# Altium footprint library bethu.PcbLib: 628 footprints (part 3 of 40)
Each footprint in its own frame and in the unit in brackets; x right, y up, seen from the top. Pads: shape width x height; smd on the part's side, far side on the other; paste and mask are expansions set on the pad; w line width, h text height; cw(c..) or ccw(c..) is an arc to the next point about the centre after c.
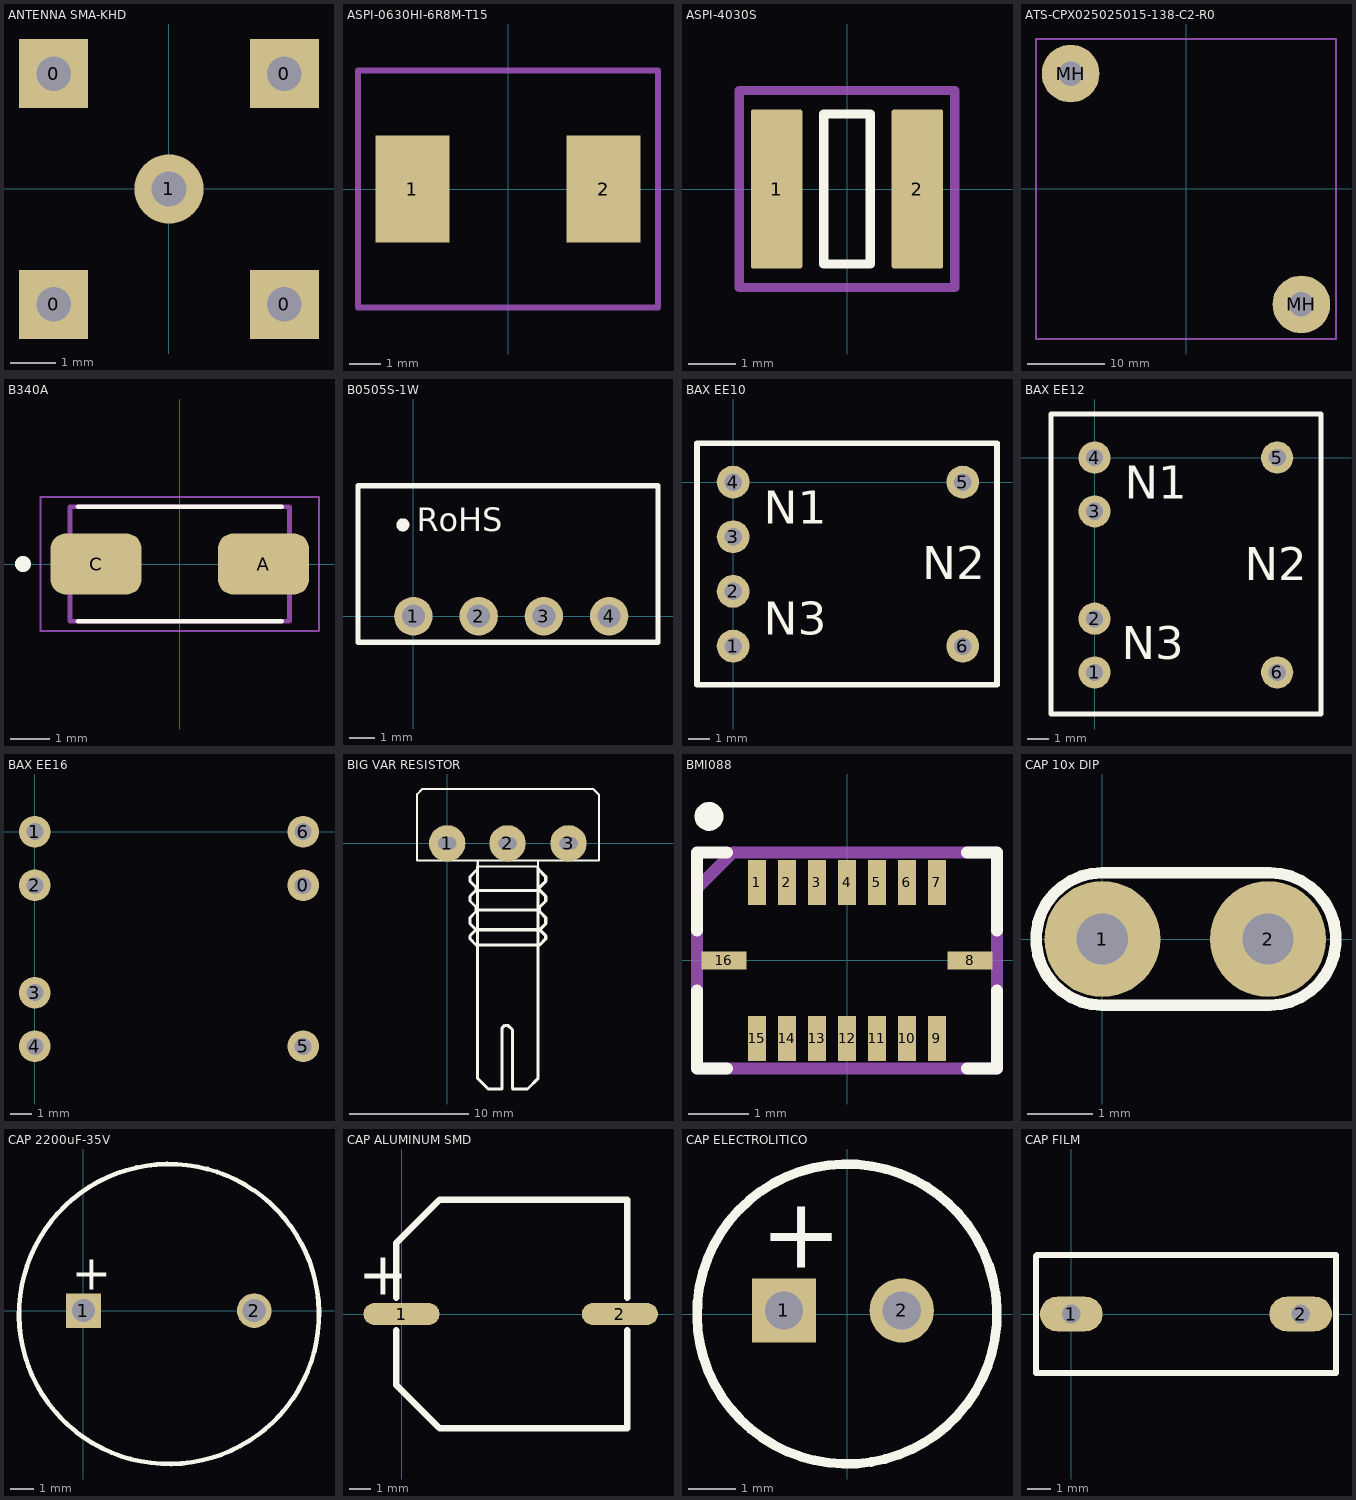
[diagram p2: the footprints below, top view; thin cyan lines are the x and y axes]

## ANTENNA SMA-KHD [mil]
pads (5):
  rect 60x60 hole 30 unplated: 0(-100,-100) 0(-100,100) 0(100,-100) 0(100,100)
  round 60 hole 30: 1(0,0)
3D body "RP_SMA Connector.SLDPRT": height 393.7, standoff -153.54, extent -137.8,-137.79 543.3,137.8

## ASPI-0630HI-6R8M-T15 [mm]
pads (2):
  rect 2.35x3.4 smd: 1(-3.025,0) 2(3.025,0)
Mechanical 13:
  lines w0.2: -4.75,-3.75 4.75,-3.75 4.75,3.75 -4.75,3.75 -4.75,-2 -4.75,-3.75
  text "'.Designator'" at -4.682,-0.75 h0.8
3D body "ASPI-0630HI.STEP": height 3.01, standoff 0.01, extent -3.6,-3.325 3.6,3.325

## ASPI-4030S [mm]
pads (2):
  rrect10% 1.1x3.4 smd: 1(-1.5,0) 2(1.5,0)
Top Overlay:
  lines w0.2: -0.5,-1.6 -0.5,1.6 0.5,1.6 0.5,-1.6 -0.5,-1.6
Mechanical 13:
  lines w0.2: -2.3,-2.1 -2.3,2.1 2.3,2.1 2.3,-2.1 0,-2.1 -2.3,-2.1
  text ".Designator" at -4.998,-0.333 h1
3D body "ASPI-4030S.STEP": height 3.01, standoff 0.01, extent -2,-2 2,2

## ATS-CPX025025015-138-C2-R0 [mm]
pads (2):
  round 7.5 hole 3.175: MH(-15,15) MH(15,-15)
Mechanical 13:
  lines w0.2: -19.5,-19.5 19.5,-19.5 19.5,19.5 -19.5,19.5 -19.5,-19.5
  text "'.Designator'" at -5.665,-0.417 h1
3D body "ATS-CPX-138-CX-R0_FUSED.STEP": height 18.5, standoff 3.5, extent -18.996,-18.996 18.996,18.996

## B340A [mm]
pads (2):
  rrect50% 2.33x1.55 smd: A(2.135,0) C(-2.135,0)
Top Overlay:
  circle w0.2: c-4,0 r0.1
  lines w0.127: -2.6,-1.46 2.6,-1.46 ; -2.6,1.46 2.6,1.46
Mechanical 13:
  circle w0.2: c-4,0 r0.1
  lines w0.127: -2.8,-1.46 2.8,-1.46 2.8,1.46 -2.8,1.46 -2.8,-1.46
Mechanical 15:
  lines w0.05: -3.55,-1.71 3.55,-1.71 3.55,1.71 -3.55,1.71 -3.55,-1.71
3D body "B340A-13.STEP": height 2.4, standoff 0, extent -2.597,-1.303 2.597,1.302

## B0505S-1W [mm]
pads (4):
  round 1.5 hole 0.9: 1(0,0) 2(2.54,0) 3(5.08,0) 4(7.62,0)
Top Overlay:
  circle w0.254: c-0.411,3.556 r0.127
  lines w0.2: -2.159,-1.016 -2.159,5.08 9.525,5.08 9.525,-1.016 -2.159,-1.016
  text "RoHS" at 0.127,3.302 h0.91
3D body "B0505S-1W.STEP": height 9.75, standoff -4.35, extent -2.117,-1.016 9.483,4.984

## BAX EE10 [mm]
pads (6):
  round 1.5 hole 0.8: 1(0,-7.5) 2(0,-5) 3(0,-2.5) 4(0,0) 5(10.5,0) 6(10.5,-7.5)
Top Overlay:
  lines w0.254: -1.651,-9.271 -1.651,1.778 12.065,1.778 12.065,-9.271 -1.651,-9.271
  text "N1" at 1.397,-1.905 h1.52
  text "N3" at 1.397,-6.985 h1.52
  text "N2" at 8.636,-4.445 h1.52
3D body "thinh_1.STEP": height 9.5, standoff -3.5, extent -1.893,-9.398 12.307,1.902

## BAX EE12 [mm]
pads (6):
  round 1.5 hole 0.8: 1(0,-10) 2(0,-7.5) 3(0,-2.5) 4(0,0) 5(8.5,0) 6(8.5,-10)
Top Overlay:
  lines w0.254: -2.032,-11.938 -2.032,2.032 10.541,2.032 10.541,-11.938 -2.032,-11.938
  text "N1" at 1.397,-1.905 h1.52
  text "N3" at 1.27,-9.398 h1.52
  text "N2" at 6.985,-5.715 h1.52
3D body "thinh_2.STEP": height 10.25, standoff -4.1, extent -1.991,-11.953 10.509,2.047

## BAX EE16 [mm]
pads (7):
  round 1.5 hole 0.8: 0(12.7,-2.54) 1(0,0) 2(0,-2.54) 3(0,-7.62) 4(0,-10.16) 5(12.7,-10.16) 6(12.7,0)
3D body "User-Library-ee-16l.STEP": height 13.5, standoff -3.5, extent -1.649,-13.207 14.351,2.793

## BIG VAR RESISTOR [mil]
pads (3):
  round 120 hole 40 slot 60 at 0 deg: 1(0,0) 2(199,0) 3(400,0)
Top Overlay:
  lines w7: 100,-57 100,-77 299,-77 299,-57 ; 101,-77 101,-57 ; -99,-57 -99,162 -82,179 482,179 500,161 500,-57 -99,-57
  lines w10: 95,-335 75,-315 75,-305 95,-285 75,-265 75,-245 95,-225 95,-210 75,-190 75,-175 95,-155 95,-145 75,-125 75,-110 100,-85 ; 95,-220 300,-220 ; 100,-770 100,-77 ; 100,-760 100,-775 135,-810 180,-810 180,-610 190,-600 200,-600 215,-615 215,-805 ; 100,-335 305,-335 325,-315 325,-305 305,-285 ; 100,-285 305,-285 ; 105,-155 300,-155 ; 215,-810 265,-810 300,-775 ; 300,-770 300,-80 ; 300,-85 325,-110 325,-125 305,-145 305,-155 325,-175 325,-190 305,-210 305,-225 325,-245 325,-265 305,-285
3D body "SW3dPS-Pot.STEP": height 839.35, standoff -130, extent -110,-818.11 510,188.11

## BMI088 [mm]
pads (16):
  rect 0.3x0.75 smd: 1(-1.5,1.3) 2(-1,1.3) 3(-0.5,1.3) 4(0,1.3) 5(0.5,1.3) 6(1,1.3) 7(1.5,1.3) 9(1.5,-1.3) 10(1,-1.3) 11(0.5,-1.3) 12(0,-1.3) 13(-0.5,-1.3) 14(-1,-1.3) 15(-1.5,-1.3)
  rect 0.75x0.3 smd: 8(2.05,0) 16(-2.05,0)
Top Overlay:
  circle w0.254: c-2.3,2.4 r0.114
  lines w0.2: -2.5,-0.5 -2.5,-1.8 -2,-1.8 ; -2.5,0.5 -2.5,1.8 -2,1.8 ; 2,-1.8 2.5,-1.8 2.5,-0.5 ; 2,1.8 2.5,1.8 2.5,0.5
Mechanical 13:
  lines w0.2: -2.5,-1.8 2.5,-1.8 2.5,1.8 -1.9,1.8 -2.5,1.2 -2.5,-1.8
  text "'.Designator'" at -5.665,-0.417 h1
3D body "BMI088.STEP": height 1.01, standoff 0.01, extent -2.25,-1.5 2.25,1.5

## CAP 10x DIP [mil]
height 200
pads (2):
  round 70 hole 31: 1(0,0) 2(100,0)
Top Overlay:
  lines w7: 100,-40 0,-40 cw(c0,0) 0,40 100,40 ; 101,-40 ccw(c101,0) 101,40
3D body "User Library-Cap 100n.step": height 265, standoff -46.85, extent -64.93,-31.79 164.93,35

## CAP 2200uF-35V [mm]
pads (2):
  rect 1.5x1.5 hole 1: 1(0,0)
  round 1.5 hole 1: 2(7.4,0)
Top Overlay:
  lines w0.2: -2.794,-0.254 ccw(c3.705,-0.147) -2.794,-0.229
  text "+" at -0.5,0.9 h1.5
3D body "User Library-JAMICON_TK_D(16)F(7_5)L(25).STEP": height 25.13, standoff -1.4, extent -4.262,-7.948 11.768,8.052

## CAP ALUMINUM SMD [mil] "330-470uF"
pads (2):
  oval 140x40 smd: 1(0,0) 2(401.57,0)
Top Overlay:
  lines w11.81: -10,-30 -10,-130 70,-210 415,-210 415,-30 ; -10,30 -10,130 70,210 415,210 415,30
  text "+" at -80,35 h80
3D body "User Library-SMD Polymer Aluminum Electrolytic Capacitors F12 330uF 16V.STEP": height 437.05, standoff -1.97, extent -16.53,-202.75 416.54,202.76

## CAP ELECTROLITICO [mm] "Capacitor  Electrolitico Radial 6.3mm diametro  x 11mm de altura (2.5mm entre pines)"
height 12
pads (2):
  rect 1.35x1.35 hole 0.8: 1(-1.325,0.075)
  round 1.35 hole 0.8: 2(1.15,0.075)
Top Overlay:
  lines w0.2: -3.15,-0.052 ccw(c0,0) 3.149,0.076 ; -3.15,-0.05 cw(c0,0) 3.145,-0.172
  text "+" at -1.825,0.975 h1.5
3D body "SW3dPS-Cap electro 6.3x11x2.5mm.STEP": height 11.53, standoff -3.01, extent -3.175,-3.176 3.175,3.175

## CAP FILM [mm]
height 5.08
pads (2):
  oval 2.7x1.5 hole 0.813: 1(0,0) 2(9.906,0)
Top Overlay:
  lines w0.254: -1.524,2.5 -1.524,-2.54 11.176,-2.54 11.43,-2.54 11.43,2.54 -1.27,2.54 -1.484,2.54
3D body "User Library-Capacitor MKT_B32591C3104 (Pitch 10mm).STEP": height 13.5, standoff -5, extent -1.524,-2.5 11.476,2.5